# Altium footprint library Zenite_Footprints.PcbLib: 44 footprints (part 1 of 3)
Each footprint in its own frame and in the unit in brackets; x right, y up, seen from the top. Pads: shape width x height; smd on the part's side, far side on the other; paste and mask are expansions set on the pad; w line width, h text height; cw(c..) or ccw(c..) is an arc to the next point about the centre after c.
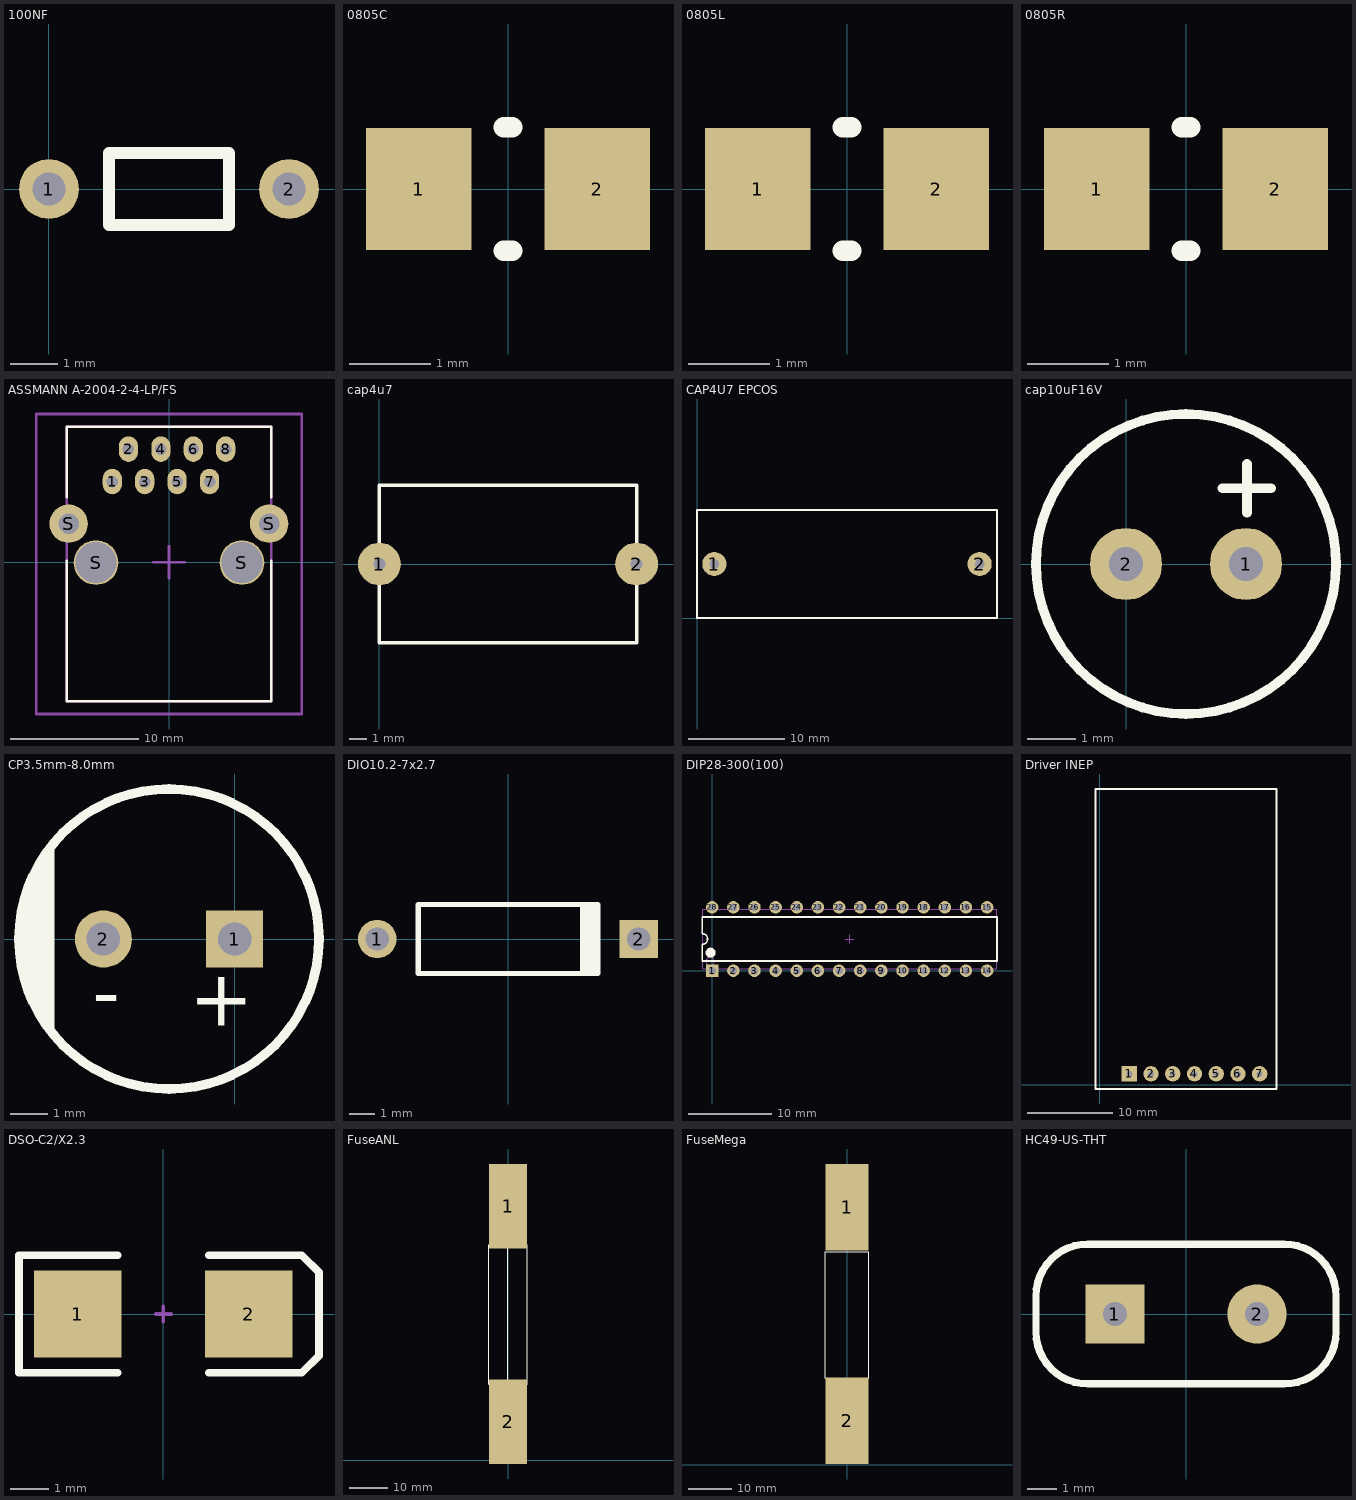
[diagram p0: the footprints below, top view; thin cyan lines are the x and y axes]

## 100NF [mm]
pads (2):
  round 1.27 hole 0.7: 1(0,0) 2(5.08,0)
Top Overlay:
  lines w0.254: 1.27,-0.762 1.27,0.762 3.81,0.762 3.81,-0.762 1.27,-0.762

## 0805C [mm] "Chip Capacitor; Body 2 x 1.3 mm (LxW typ)"
height 0.6
pads (2):
  rect 1.3x1.5 smd: 1(-1.1,0) 2(1.1,0)
Top Overlay:
  lines w0.254: -0.051,-0.762 0.051,-0.762 ; -0.051,0.762 0.051,0.762
3D body: height 0.78, standoff 0, extent -1,-0.635 1,0.615

## 0805L [mm] "Chip Inductor; Body 2 x 1.3 mm (LxW typ)"
height 0.6
pads (2):
  rect 1.3x1.5 smd: 1(-1.1,0) 2(1.1,0)
Top Overlay:
  lines w0.254: -0.051,-0.762 0.051,-0.762 ; -0.051,0.762 0.051,0.762
3D body: height 0.95, standoff 0, extent -1,-0.61 1,0.59

## 0805R [mm] "Chip Resistor; Body 2 x 1.3 mm (LxW typ)"
height 0.6
pads (2):
  rect 1.3x1.5 smd: 1(-1.1,0) 2(1.1,0)
Top Overlay:
  lines w0.254: -0.051,-0.762 0.051,-0.762 ; -0.051,0.762 0.051,0.762
3D body: height 0.8, standoff 0.02, extent -1.009,-0.625 0.991,0.625

## ASSMANN A-2004-2-4-LP/FS [mm]
height 13.3
pads (12):
  oval 1.5x2 hole 0.9: 1(-4.445,6.31) 2(-3.175,8.85) 3(-1.905,6.31) 4(-0.635,8.85) 5(0.635,6.31) 6(1.905,8.85) 7(3.175,6.31) 8(4.445,8.85)
  round 3 hole 1.6: S(-7.855,3.01) S(7.845,3.01)
  round 3.5 hole 3.2: S(-5.715,-0.04) S(5.715,-0.04)
Top Overlay:
  lines w0.2: -8,0.1 -8,-10.9 8,-10.9 8,0.1 ; -8,5.1 -8,10.6 8,10.6 8,5.1
Mechanical 1:
  lines w0.2: -8,-10.9 -8,10.6 8,10.6 8,-10.9 -8,-10.9
Mechanical 15:
  lines w0.2: -1.25,0 1.25,0 ; 0,-1.25 0,1.25 ; -10.4,-11.9 10.4,-11.9 10.4,11.6 -10.4,11.6 -10.4,-11.9
3D body: height 13.6, standoff -3.5, extent -8,-10.9 8,10.6

## cap4u7 [mm] "9.2x16.3mm"
height 15.3
pads (2):
  round 2.5 hole 0.7: 1(0,0) 2(15,0)
Top Overlay:
  lines w0.2: 0,-4.6 15,-4.6 15,4.6 0,4.6 0,-4.6
3D body: height 15, standoff 0, extent -0.1,-4.7 15.1,4.7

## CAP4U7 EPCOS [mm] "30x11"
height 20
pads (2):
  round 2.5 hole 1: 1(1.8,5.6) 2(29.3,5.6)
Top Overlay:
  lines w0.2: 0,0 31.1,0 31.1,11.2 0,11.2 0,0
3D body: height 20, standoff 0, extent -0.1,-0.1 31.2,11.3

## cap10uF16V [mm]
pads (2):
  round 1.5 hole 0.7: 1(2.5,0) 2(0,0)
Top Overlay:
  circle w0.2: c1.25,0 r3.125
  lines w0.2: 2.007,1.575 3.023,1.575 ; 2.521,1.067 2.521,2.083
3D body: height 10.51, standoff -3, extent -1.91,-3.176 4.4,3.124

## CP3.5mm-8.0mm [mil] "Capacitor, Electrolytic, Radial; Body 8 x 10.5 mm (Dia.xH typ); Pin Spacing 3.5 mm (typ)"
height 452.76
pads (2):
  rect 60x60 hole 35: 1(0,0)
  round 60 hole 35: 2(-137.8,0)
Top Overlay:
  circle w10: c-68.9,0 r157.48
  region: -195,-90 -195,90 -210,75 -210,65 -220,55 -220,35 -225,30 -225,-25 -220,-30 -220,-45 -215,-50 -215,-60 -210,-65 -210,-70 -205,-75 -205,-80
  lines w10: -193.9,-95 -193.9,95
  text "-" at -120,-40 h59.06
  text "+" at 20,-40 h59.06
3D body: height 468.44, standoff -141.91, extent -226,-160 90.96,156.96

## DIO10.2-7x2.7 [mm] "Diode, Axial; Body 7 x 2.7 mm (LxDia. max), Lead Dia. 0.53 mm (max)"
height 2.7
pads (2):
  round 1.5 hole 0.9: 1(-5.1,0)
  rect 1.5x1.5 hole 0.9: 2(5.1,0)
Top Overlay:
  rectangle: 2.8,-1.35 3.6,1.35
  lines w0.2: 3.5,-1.35 -3.5,-1.35 -3.5,1.35 3.5,1.35
3D body: height 2.73, standoff -2.6, extent -5.588,-1.397 5.436,1.343

## DIP28-300(100) [mm] "DIP, 28-Leads, Row Spacing 7.62mm, Pitch 2.54mm, Body 34.67x7.3mm"
height 4.58
pads (28):
  rect 1.5x1.5 hole 0.9: 1(0,0)
  round 1.5 hole 0.9: 2(2.54,0) 3(5.08,0) 4(7.62,0) 5(10.16,0) 6(12.7,0) 7(15.24,0) 8(17.78,0) 9(20.32,0) 10(22.86,0) 11(25.4,0) 12(27.94,0) 13(30.48,0) 14(33.02,0) 15(33.02,7.62) 16(30.48,7.62) 17(27.94,7.62) 18(25.4,7.62) 19(22.86,7.62) 20(20.32,7.62) 21(17.78,7.62) 22(15.24,7.62) 23(12.7,7.62) 24(10.16,7.62) 25(7.62,7.62) 26(5.08,7.62) 27(2.54,7.62) 28(0,7.62)
Top Overlay:
  circle w0.6: c-0.19,2.16 r0.3
  lines w0.2: -1.19,1.16 34.21,1.16 34.21,6.46 -1.19,6.46 -1.19,4.445 cw(c-1.19,3.81) -1.19,3.175 -1.19,1.16
Mechanical 13:
  circle w0.1: c-0.24,1.11 r0.5
  lines w0.1: -1.14,0.21 34.16,0.21 34.16,7.41 -1.14,7.41 -1.14,0.21
Mechanical 15:
  lines w0.1: 16.01,3.81 17.01,3.81 ; 16.51,3.31 16.51,4.31
3D body: height 5.08, standoff -2.49, extent -1.397,-0.127 34.603,7.743

## Driver INEP [mm] "Connector; Header; 7 Position"
pads (7):
  rect 1.8x1.8 hole 0.7: 1(3.429,1.27)
  round 1.8 hole 0.7: 2(5.969,1.27) 3(8.509,1.27) 4(11.049,1.27) 5(13.589,1.27) 6(16.129,1.27) 7(18.669,1.27)
Top Overlay:
  lines w0.2: -0.508,-0.508 20.625,-0.508 20.625,34.544 -0.508,34.544 -0.508,-0.508
3D body: height 10.03, standoff 0.37, extent -0.597,-0.483 20.612,34.569
3D body: height 6.2, standoff -3, extent 2.261,0.021 20.041,2.519

## DSO-C2/X2.3 [mm] "DO-214-AA/SMB; 2 C-Bend Leads; Body 5.3 x 3.6 mm, inc. leads (LxW)"
height 2.54
pads (2):
  rect 2.3x2.3 smd: 1(-2.25,0) 2(2.25,0)
Top Overlay:
  lines w0.2: -1.2,-1.55 -3.8,-1.55 -3.8,1.55 -1.2,1.55 ; 1.2,-1.55 3.65,-1.55 4.1,-1.1 4.1,1.1 3.65,1.55 1.2,1.55
Mechanical 1:
  lines w0.1: -0.2,0 0.2,0 ; 0,-0.2 0,0.2
3D body: height 2.64, standoff -0.04, extent -2.616,-1.349 2.584,1.321

## FuseANL [mm]
pads (2):
  rect 10x22.2 smd: 1(0,66.675) 2(0,10.16)
Top Overlay:
  lines w0.254: -0.127,6.985 -0.127,67.985 ; 4.996,56.642 -5,56.642 -5,20 5,20 5,56.6
3D body: height 18.95, standoff -0.1, extent -5.416,0.483 5.314,69.063

## FuseMega [mm]
pads (2):
  rect 10x20 smd: 1(0,59.436) 2(0,10.16)
Top Overlay:
  lines w0.254: -5.004,49.225 4.996,49.225 ; -5,49.2 -5,20 5,20 5,49.2
3D body: height 18.95, standoff -0.1, extent -5.416,0.483 5.314,69.063

## HC49-US-THT [mil] "THT Quartz Crystal"
pads (2):
  rect 80x80 hole 32: 1(-96.06,0)
  round 80 hole 32: 2(96.06,0)
Top Overlay:
  lines w10: -202.76,-24.49 ccw(c-132.76,-24.49) -132.76,-94.49 132.76,-94.49 ccw(c132.76,-24.49) 202.76,-24.49 202.76,24.49 ccw(c132.76,24.49) 132.76,94.49 -132.76,94.49 ccw(c-132.76,24.49) -202.76,24.49 -202.76,-24.49
3D body: height 137.8, standoff -157.48, extent -223.13,-91.06 223.72,92.01